# Altium schematic symbol library BARKO_SCHLIB.SchLib: 1064 symbols (part 6 of 11)
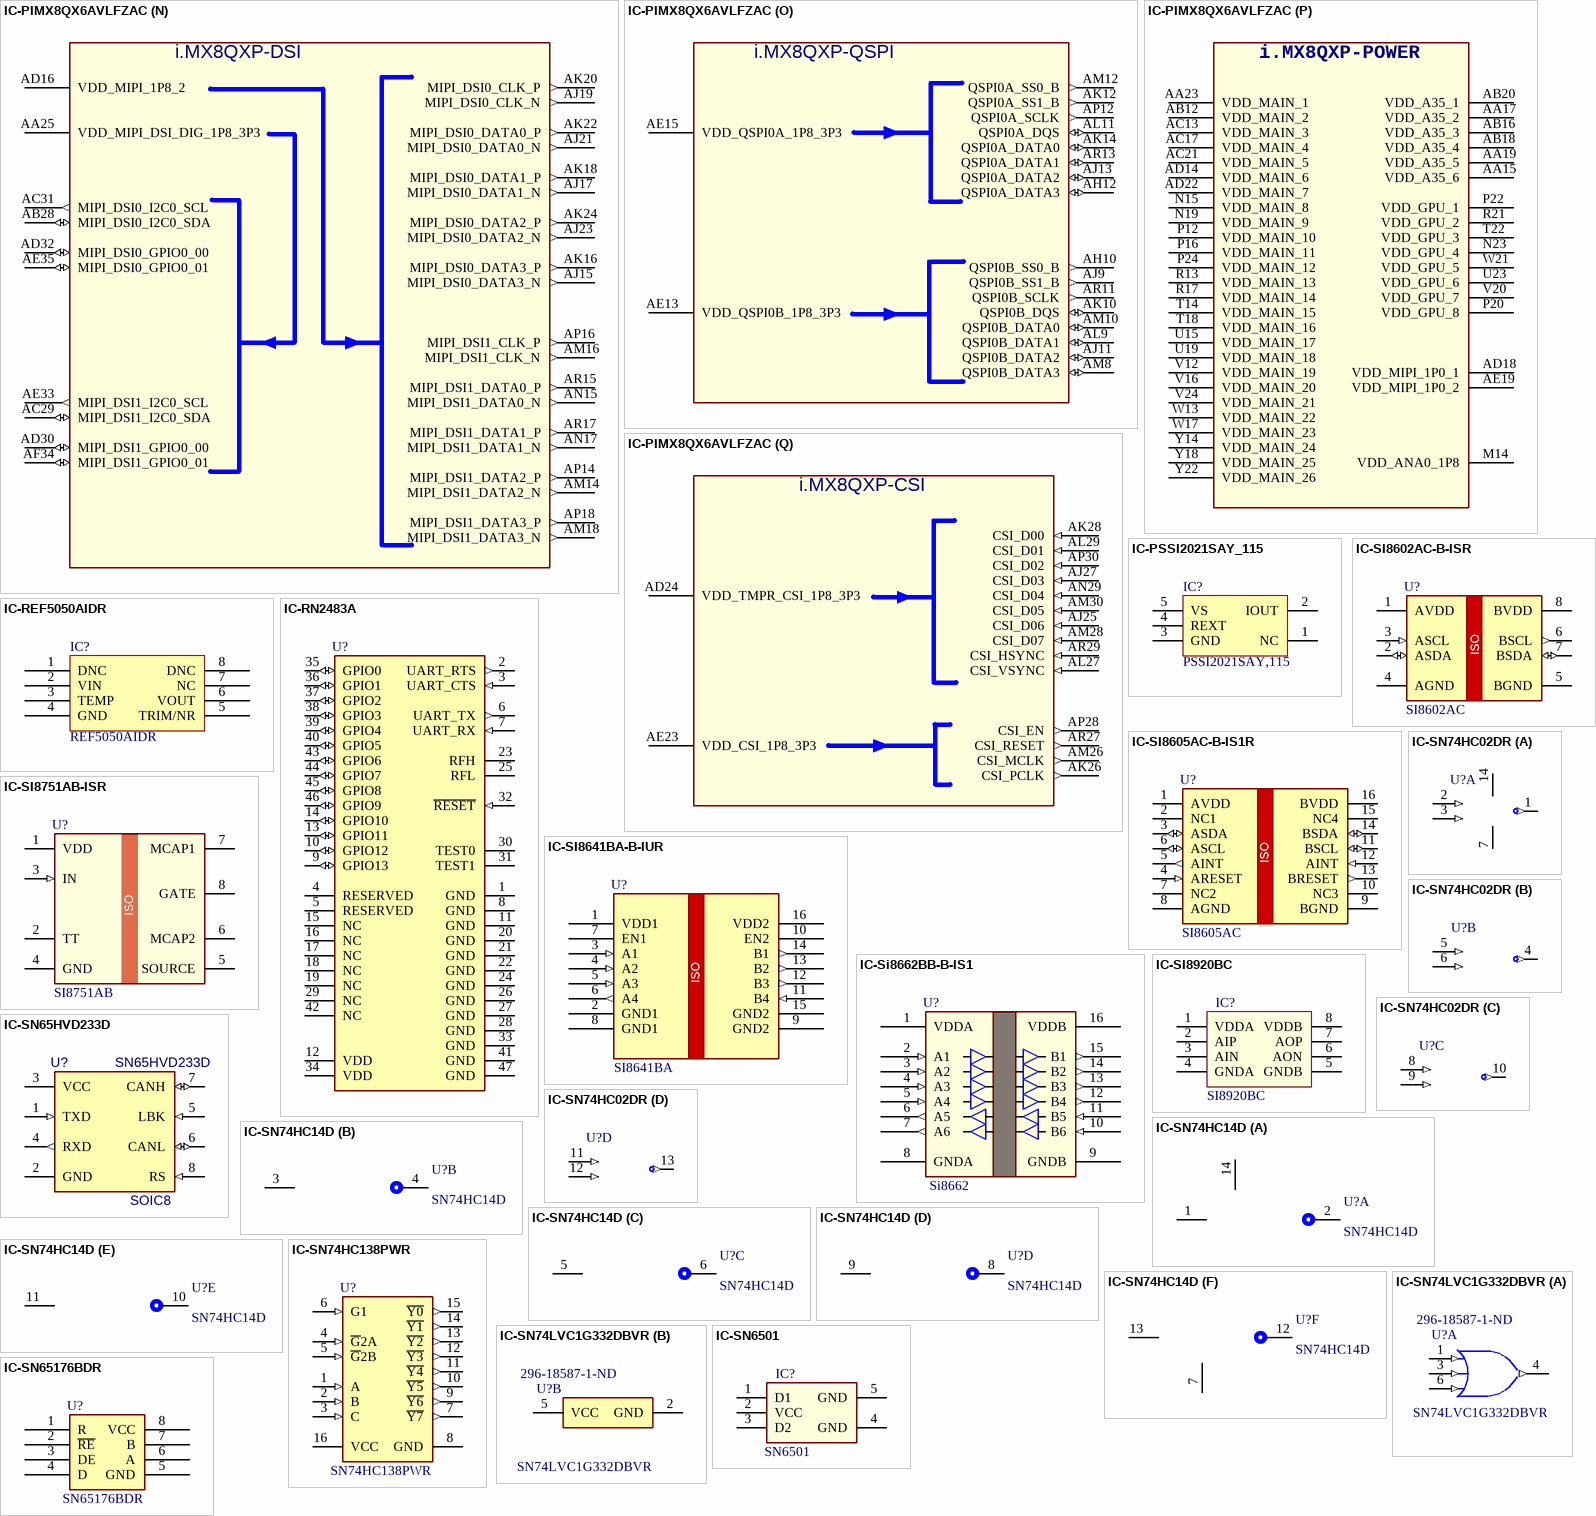
[diagram p46: symbols IC-PIMX8QX6AVLFZAC to IC-SN65176BDR]

## IC-RN2483A
designator U?, comment RN2483A-I/RM103  (value not drawn)
MODULE LORA LONG RANGE; Manufacturer: Microchip; Interface: I2C,SPI,UART; Frequency: 868MHz; Data Rate: 300Kbps; Sensitivity: -146dBm; Current - Receiving: 14mA; Current - Transmitting: 39mA; Washability: OK; .Creator: M.OZKAN; .PCBCHK: USED; Datasheet URL: http://www.microchip.com/mymicrochip/filehandler.aspx?ddocname=en574289; Package Description: 47-Pin Surface Mount Device, Body 26.67 x 17.78 mm, Pitch 1.27 mm; Package Reference: MODULE-47; RoHSCompliant: false; Mounting Technology: SurfaceMount; Datasheet Version: Rev. C, 04/2017; Manufacturer URL: http://www.microchip.com/; Supplier 1: Digi-Key; Supplier Part Number 1: RN2483A-I/RM103-ND; Manufacturer Part Number: RN2483A-I/RM103; Stock 1: 0; Pricing 1: 1=13.18000, 25=12.05120 (USD); RoHS: No; Mount: Surface Mount; Case/Package: Module; Min Operating Temperature: -40°C; Max Operating Temperature: 85°C; Packaging: Tray; ComponentLink1URL: http://www.farnell.com/datasheets/2140371.pdf?src-supplier=Farnell; ComponentLink1Description: http://www.farnell.com/datasheets/2140371.pdf?src-supplier=Farnell; ComponentLink2URL: http://www.microchip.com/mymicrochip/filehandler.aspx?ddocname=en584959&src-supplier=Digi-Key; ComponentLink2Description: http://www.microchip.com/mymicrochip/filehandler.aspx?ddocname=en584959&src-supplier=Digi-Key; .SCHCHK: USED
footprint MCHP-MODULE-47_V (SMD, 47-Leads, Body 26.67x17.78mm, Pitch 1.27mm)
pins: 1 GND (power) "Ground supply terminal", 2 UART_RTS (out) "Communication UART RTS signal, or GPIO", 3 UART_CTS (in) "Communication UART CTS signal, or GPIO", 4 RESERVED "Do not connect", 5 RESERVED "Do not connect", 6 UART_TX (out) "Communication UART Transmit (TX)", 7 UART_RX (in) "Communication UART Receive (RX)", 8 GND (power) "Ground supply terminal", 9 GPIO13 (io) "General purpose I/O pin or analog input", 10 GPIO12 (io) "General purpose I/O pin or analog input", 11 GND (power) "Ground supply terminal", 12 VDD (power) "Positive supply terminal", 13 GPIO11 (io) "General purpose I/O pin or analog input", 14 GPIO10 (io) "General purpose I/O pin or analog input", 15 NC "Not connected", 16 NC "Not connected", 17 NC "Not connected", 18 NC "Not connected", 19 NC "Not connected", 20 GND (power) "Ground supply terminal", 21 GND (power) "Ground supply terminal", 22 GND (power) "Ground supply terminal", 23 RFH "RF signal pin for high band", 24 GND (power) "Ground supply terminal", 25 RFL "RF signal pin for low band", 26 GND (power) "Ground supply terminal", 27 GND (power) "Ground supply terminal", 28 GND (power) "Ground supply terminal", 29 NC "Not connected", 30 TEST0, 31 TEST1, 32 ~{RESET} (in) "Active-low device Reset input", 33 GND (power) "Ground supply terminal", 34 VDD (power) "Positive supply terminal", 35 GPIO0 (io) "General purpose I/O pin or analog input", 36 GPIO1 (io) "General purpose I/O pin or analog input", 37 GPIO2 (io) "General purpose I/O pin or analog input", 38 GPIO3 (io) "General purpose I/O pin or analog input", 39 GPIO4 (io) "General purpose I/O pin", 40 GPIO5 (io) "General purpose I/O pin or analog input", 41 GND (power) "Ground supply terminal", 42 NC "Not connected", 43 GPIO6 (io) "General purpose I/O pin or analog input", 44 GPIO7 (io) "General purpose I/O pin or analog input", 45 GPIO8 (io) "General purpose I/O pin or analog input", 46 GPIO9 (io) "General purpose I/O pin or analog input", 47 GND (power) "Ground supply terminal"

## IC-SI8602AC-B-ISR
designator U?, comment SI8602AC
DGTL ISOL 3750VRMS 2CH I2C 8SOIC; Manufacturer: Silicon Labs; Manufacturer Part Number: SI8602AC-B-ISR; Polarity: Unidirectional,Bidirectional; Isolated Power: No; Pulse Width Distortion (PWD): 32ns; Number of Channels: 2; Data Rate: 10Mbps; Propagation Delay: 26ns; Channel Type: Bidirectional; Supplier 1: Digi-Key; Supplier Part Number 1: 336-4925-1-ND; Stock: 2635; Pricing: 1=2.99, 25=2.8792, 100=2.7685 (USD); RoHS: Yes; Case/Package: SOIC; Number of Pins: 8; Weight: 0.006596oz; Min Operating Temperature: -40°C; Max Operating Temperature: 125°C; Package Quantity: 2500; Packaging: Tape and Reel; ComponentLink1URL: https://datasheet.ciiva.com/14939/supportdocuments2ftechnicaldocs2fsi860x-14939771.pdf?src-supplier=Digi-Key; ComponentLink1Description: https://datasheet.ciiva.com/14939/supportdocuments2ftechnicaldocs2fsi860x-14939771.pdf?src-supplier=Digi-Key
footprint SOIC8-D0008A_M (SOIC, 8-Leads, Body 5x4mm, Pitch 1.27mm, IPC Low Density)
pins: 1 AVDD (power), 2 ASDA (io), 3 ASCL (in), 4 AGND (power), 5 BGND (power), 6 BSCL (out), 7 BSDA (io), 8 BVDD (power)
text: ISO

## IC-SI8605AC-B-IS1R
designator U?, comment SI8605AC
DGT ISOL 3750VRMS 4CH I2C 16SOIC; Manufacturer: Silicon Labs; Manufacturer Part Number: SI8605AC-B-IS1R; Channel Type: Bidirectional; Polarity: Unidirectional,Bidirectional; Max Power Dissipation: 275mW; Number of Channels: 4; Data Rate: 10Mbps; Propagation Delay: 26ns; Isolated Power: No; Pulse Width Distortion (PWD): 32ns; Supplier 1: Digi-Key; Supplier Part Number 1: 336-4927-1-ND; Stock: 6049; Pricing: 1=3.8, 25=3.6548, 100=3.5143, 1000=3.1866 (USD); RoHS: Yes; Case/Package: SOIC; Weight: 0.005069oz; Min Operating Temperature: -40°C; Max Operating Temperature: 125°C; Package Quantity: 2500; Packaging: Tape and Reel; ComponentLink1URL: https://datasheet.ciiva.com/14939/supportdocuments2ftechnicaldocs2fsi860x-14939670.pdf?src-supplier=Digi-Key; ComponentLink1Description: https://datasheet.ciiva.com/14939/supportdocuments2ftechnicaldocs2fsi860x-14939670.pdf?src-supplier=Digi-Key
footprint SOIC16
pins: 1 AVDD (power), 2 NC1, 3 ASDA (io), 4 ARESET (in), 5 AINT (out), 6 ASCL (io), 7 NC2, 8 AGND, 9 BGND, 10 NC3, 11 BSCL (io), 12 AINT (in), 13 BRESET (out), 14 BSDA (io), 15 NC4, 16 BVDD
text: ISO

## IC-SI8641BA-B-IUR
designator U?, comment SI8641BA
DGTL ISO 1KV 4CH GEN PURP 16QSOP; Manufacturer: Silicon Labs; Manufacturer Part Number: SI8641BA-B-IUR; Number of Channels: 4; Data Rate: 150Mbps; Propagation Delay: 13ns; Channel Type: Unidirectional; Isolated Power: No; Pulse Width Distortion (PWD): 4.5ns; Washability: OK; .Creator: M.OZKAN; .PCBCHK: USED; Supplier 1: Digi-Key; Stock 1: 2478; Pricing 1: 1=2.51000, 25=2.42080, 100=2.32780 (USD); RoHS: Yes; Case/Package: QSOP; Number of Pins: 16; Weight: 0.002931oz; Min Operating Temperature: -40°C; Max Operating Temperature: 125°C; Package Quantity: 2500; Packaging: Tape and Reel; Type: General Purpose; ComponentLink1URL: https://datasheet.ciiva.com/15273/si864x-15273040.pdf?src-supplier=Arrow+Europe; ComponentLink1Description: https://datasheet.ciiva.com/15273/si864x-15273040.pdf?src-supplier=Arrow+Europe; ComponentLink2URL: https://datasheet.ciiva.com/14939/supportdocuments2ftechnicaldocs2fsi864x-14939870.pdf?src-supplier=Digi-Key; ComponentLink2Description: https://datasheet.ciiva.com/14939/supportdocuments2ftechnicaldocs2fsi864x-14939870.pdf?src-supplier=Digi-Key; Supplier Part Number 1: 336-4333-1-ND; .SCHCHK: USED
footprint 16-SSOP
pins: 1 VDD1, 2 GND1, 3 A1 (in), 4 A2 (in), 5 A3 (in), 6 A4 (out), 7 EN1, 8 GND1, 9 GND2, 10 EN2, 11 B4 (in), 12 B3 (out), 13 B2 (out), 14 B1 (out), 15 GND2, 16 VDD2
text: ISO

## IC-Si8662BB-B-IS1
designator U?, comment Si8662
DGTL ISO 2.5KV GEN PURP 16SOIC; Manufacturer: Silicon Labs; Manufacturer Part Number: Si8662BB-B-IS1; Number of Channels: 6; Data Rate: 150Mbps; Propagation Delay: 13ns; Min Supply Voltage: 2.5V; Max Supply Voltage: 5.5V; Max Power Dissipation: 415mW; Channel Type: Unidirectional; Turn-On Delay Time: 10ns; Operating Supply Current: 19.4mA; Isolated Power: No; Pulse Width Distortion (PWD): 4.5ns; Max Input Current: 10.5mA; Rise Time: 4ns; Washability: OK; .Creator: M.OZKAN; .PCBCHK: USED; Supplier 1: Digi-Key; Stock 1: 2241; Pricing 1: 1=3,16000, 25=3,04360, 100=2,92670, 1000=2,72330 (USD); RoHS: Yes; Mount: Surface Mount; Case/Package: SOIC; Number of Pins: 16; Contact Plating: Tin,Matte; Min Operating Temperature: -40°C; Max Operating Temperature: 125°C; Packaging: Rail/Tube; Package Quantity: 48; Polarity: Unidirectional; Isolation Voltage: 2.5kV; Type: General Purpose; Length: 9.9mm; Depth: 1.25mm; Width: 3.9mm; REACH SVHC: Unknown; ComponentLink1URL: http://www.farnell.com/datasheets/2244979.pdf?src-supplier=Farnell; ComponentLink1Description: http://www.farnell.com/datasheets/2244979.pdf?src-supplier=Farnell; ComponentLink2URL: http://www.mouser.com/ds/2/368/Si866x-41125.pdf?src-supplier=Mouser; ComponentLink2Description: http://www.mouser.com/ds/2/368/Si866x-41125.pdf?src-supplier=Mouser; ComponentLink3URL: https://www.silabs.com/Support%20Documents/TechnicalDocs/Si866x.pdf?src-supplier=Digi-Key; ComponentLink3Description: https://www.silabs.com/Support%20Documents/TechnicalDocs/Si866x.pdf?src-supplier=Digi-Key; ComponentLink4URL: http://www.silabs.com/Support%20Documents/TechnicalDocs/Si866x.pdf?src-supplier=Avnet; ComponentLink4Description: http://www.silabs.com/Support%20Documents/TechnicalDocs/Si866x.pdf?src-supplier=Avnet; ComponentLink5URL: http://www.farnell.com/datasheets/1816593.pdf?src-supplier=Element14; ComponentLink5Description: http://www.farnell.com/datasheets/1816593.pdf?src-supplier=Element14; ComponentLink6URL: http://www.silabs.com/Support%20Documents/TechnicalDocs/Si866x.pdf?src-supplier=Avnet+Asia; ComponentLink6Description: http://www.silabs.com/Support%20Documents/TechnicalDocs/Si866x.pdf?src-supplier=Avnet+Asia; Supplier Part Number 1: SI8662BB-B-IS1-ND; .SCHCHK: USED
footprint SOIC16
pins: 1 VDDA (power), 2 A1 (in), 3 A2 (in), 4 A3 (in), 5 A4 (in), 6 A5 (out), 7 A6 (out), 8 GNDA (power), 9 GNDB (power), 10 B6 (in), 11 B5 (in), 12 B4 (out), 13 B3 (out), 14 B2 (out), 15 B1 (out), 16 VDDB (power)

## IC-SI8751AB-ISR
designator U?, comment SI8751AB
DGTL ISO 2.5KV GATE DRIVER 8SOIC; Manufacturer: Silicon Labs; Manufacturer Part Number: SI8751AB-ISR; Number of Channels: 1; Approvals: CSA,VDE,UR,CQC; Supplier 1: Digi-Key; Supplier Part Number 1: 336-3797-1-ND; Stock: 2422; Pricing: 1=1.38, 25=1.328, 100=1.2769 (USD); RoHS: Yes; Mount: Surface Mount; Case/Package: SOIC; Number of Pins: 8; Min Operating Temperature: -40°C; Max Operating Temperature: 105°C; Packaging: Tape and Reel; REACH SVHC: No SVHC; ComponentLink1URL: https://www.silabs.com/documents/public/data-sheets/Si8751-2.pdf?src-supplier=Digi-Key; ComponentLink1Description: https://www.silabs.com/documents/public/data-sheets/Si8751-2.pdf?src-supplier=Digi-Key; ComponentLink2URL: http://www.farnell.com/datasheets/2131143.pdf?src-supplier=Element14; ComponentLink2Description: http://www.farnell.com/datasheets/2131143.pdf?src-supplier=Element14; ComponentLink3URL: http://www.farnell.com/datasheets/2247952.pdf?src-supplier=Newark; ComponentLink3Description: http://www.farnell.com/datasheets/2247952.pdf?src-supplier=Newark; ComponentLink4URL: http://www.silabs.com/documents/public/data-sheets/Si8751-2.pdf?src-supplier=Digi-Key; ComponentLink4Description: http://www.silabs.com/documents/public/data-sheets/Si8751-2.pdf?src-supplier=Digi-Key
footprint SOIC8-D0008A_M (SOIC, 8-Leads, Body 5x4mm, Pitch 1.27mm, IPC Low Density)
pins: 1 VDD (power), 2 TT, 3 IN (in), 4 GND (power), 5 SOURCE, 6 MCAP2, 7 MCAP1, 8 GATE
text: ISO

## IC-SI8920BC
designator IC?, comment SI8920BC
IC ISOLATION 8DIP GULL WING; Manufacturer: Silicon Labs; Manufacturer Part Number: SI8920BC-IPR; Gain Bandwidth Product: 750kHz; Min Supply Voltage: 3V; Max Supply Voltage: 5.5V; Supplier 1: Mouser; Stock 1: 2163; Pricing 1: 1=2.93000, 10=2.88000, 25=2.82000, 50=2.77000, 100=2.71000, 250=2.70000 (USD); RoHS: Yes; Mount: Surface Mount; Case/Package: SMD/SMT; Number of Pins: 8; Min Operating Temperature: -40°C; Max Operating Temperature: 125°C; ComponentLink1URL: http://www.silabs.com/Support%20Documents/TechnicalDocs/Si8920.pdf?src-supplier=Avnet; ComponentLink1Description: http://www.silabs.com/Support%20Documents/TechnicalDocs/Si8920.pdf?src-supplier=Avnet; ComponentLink2URL: https://www.silabs.com/documents/public/data-sheets/si8920-datasheet.pdf?src-supplier=Digi-Key; ComponentLink2Description: https://www.silabs.com/documents/public/data-sheets/si8920-datasheet.pdf?src-supplier=Digi-Key; ComponentLink3URL: http://www.silabs.com/documents/public/data-sheets/si8920-datasheet.pdf?src-supplier=Digi-Key; ComponentLink3Description: http://www.silabs.com/documents/public/data-sheets/si8920-datasheet.pdf?src-supplier=Digi-Key; Supplier Part Number 1: 634-SI8920BC-IPR
footprint 8-SMD-Gull Wing
pins: 1 VDDA, 2 AIP, 3 AIN, 4 GNDA, 5 GNDB, 6 AON, 7 AOP, 8 VDDB

## IC-SN65HVD233D
designator U?, comment SN65HVD233D  Case/Package: SOIC8
IC 3.3V CAN TXRX 8-SOIC; Manufacturer: Texas Instruments; Data Rate: 1Mbps; Max Supply Voltage: 3.6V; Min Supply Voltage: 3V; Nominal Supply Current: 6mA; Number of Transceivers: 1; .PCBCHK: USED; .Creator: F:TALI; Washability: OK; Supplier 1: Digi-Key; Manufacturer Part Number: SN65HVD233D; Stock 1: 13664; Pricing 1: 1=3.13, 10=2.816, 75=2.66173, 150=2.30687, 525=1.96377, 1050=1.6562, 2550=1.57339, 5025=1.51424 (USD); Number of Pins: 8; Weight: 0.002561oz; Contact Plating: Gold; Min Operating Temperature: -40°C; Max Operating Temperature: 125°C; Package Quantity: 75; Packaging: Rail/Tube; Number of Drivers: 1; Number of Receivers: 1; Operating Supply Voltage: 3.3V; Max Supply Current: 6mA; Length: 4.9mm; Height: 1.58mm; Width: 3.91mm; Radiation Hardening: No; Lead Free: Lead Free; REACH SVHC: No SVHC; ComponentLink1URL: http://www.ti.com/lit/ds/symlink/sn65hvd233.pdf; ComponentLink1Description: http://www.ti.com/lit/ds/symlink/sn65hvd233.pdf; ComponentLink2URL: http://www.ti.com/general/docs/lit/getliterature.tsp?genericPartNumber=SN65HVD233&amp;&amp;fileType=pdf; ComponentLink2Description: http://www.ti.com/general/docs/lit/getliterature.tsp?genericPartNumber=SN65HVD233&amp;&amp;fileType=pdf; ComponentLink3URL: http://www.jameco.com/Jameco/Products/ProdDS/909986.pdf; ComponentLink3Description: http://www.jameco.com/Jameco/Products/ProdDS/909986.pdf; ComponentLink4URL: http://www.produktinfo.conrad.com/datenblaetter/1100000-1199999/001186923-da-01-en-IC_3_3V_CAN_TXRX_SN65HVD233D_SOIC_8_TID.pdf; ComponentLink4Description: http://www.produktinfo.conrad.com/datenblaetter/1100000-1199999/001186923-da-01-en-IC_3_3V_CAN_TXRX_SN65HVD233D_SOIC_8_TID.pdf; Supplier Part Number 1: 296-14639-5-ND; .SCHCHK: USED
footprint SOIC8
pins: 1 TXD (in), 2 GND (power), 3 VCC (power), 4 RXD (out), 5 LBK (in), 6 CANL (io), 7 CANH (io), 8 RS (in)

## IC-SN74HC02DR
designator U?, comment NOR Gate IC 4 Channel 14-SOIC  (value not drawn)
IC GATE NOR 4CH 2-INP 14-SOIC; Manufacturer: Texas Instruments; Manufacturer Part Number: SN74HC02DR; Propagation Delay: 15ns; Number of Inputs: 2; Low Level Output Current: 5.2mA; Number of Circuits: 4; Quiescent Current: 2uA; Washability: OK; .Creator: M.OZKAN; .PCBCHK: USED; ComponentLink1URL: https://datasheet.ciiva.com/27050/914566-27050911.pdf?src-supplier=Jameco; ComponentLink1Description: https://datasheet.ciiva.com/27050/914566-27050911.pdf?src-supplier=Jameco; ComponentLink2URL: https://datasheet.ciiva.com/15090/getdatasheetpartid-71593-15090525.pdf?src-supplier=Verical; ComponentLink2Description: https://datasheet.ciiva.com/15090/getdatasheetpartid-71593-15090525.pdf?src-supplier=Verical; ComponentLink3URL: https://datasheet.ciiva.com/1864/sn74hc02-1864695.pdf?src-supplier=Digi-Key; ComponentLink3Description: https://datasheet.ciiva.com/1864/sn74hc02-1864695.pdf?src-supplier=Digi-Key; ComponentLink4URL: https://datasheet.ciiva.com/1864/sn74hc02-1864697.pdf?src-supplier=Digi-Key; ComponentLink4Description: https://datasheet.ciiva.com/1864/sn74hc02-1864697.pdf?src-supplier=Digi-Key; ComponentLink5URL: https://datasheet.ciiva.com/26242/sn74hc02-26242831.pdf?src-supplier=Avnet+Europe; ComponentLink5Description: https://datasheet.ciiva.com/26242/sn74hc02-26242831.pdf?src-supplier=Avnet+Europe; ComponentLink6URL: https://datasheet.ciiva.com/46393/1882828-46393797.pdf?src-supplier=Element14; ComponentLink6Description: https://datasheet.ciiva.com/46393/1882828-46393797.pdf?src-supplier=Element14; ComponentLink7URL: https://datasheet.ciiva.com/14290/sn74hc02-14290503.pdf?src-supplier=Avnet; ComponentLink7Description: https://datasheet.ciiva.com/14290/sn74hc02-14290503.pdf?src-supplier=Avnet; ComponentLink8URL: https://datasheet.ciiva.com/1864/sn74hc02-1864696.pdf?src-supplier=Digi-Key; ComponentLink8Description: https://datasheet.ciiva.com/1864/sn74hc02-1864696.pdf?src-supplier=Digi-Key; Supplier 1: Digi-Key; Supplier Part Number 1: 296-1188-6-ND; Stock 1: 4392; Pricing 1: 1=0.41000, 10=0.30800, 100=0.19180, 500=0.13122, 1000=0.10094 (USD); RoHS: Yes; Mount: Surface Mount; Case/Package: SOIC; Number of Pins: 14; Min Operating Temperature: -40°C; Max Operating Temperature: 85°C; Packaging: Tape and Reel; Logic Function: NOR; High Level Output Current: 5.2mA; Number of Bits: 4; Lead Free: Lead Free; .SCHCHK: USED
footprint IC-D14-NOR
part A pins: 1 (out), 2 (in), 3 (in), 7, 14
part B pins: 4 (out), 5 (in), 6 (in)
part C pins: 8 (in), 9 (in), 10 (out)
part D pins: 11 (in), 12 (in), 13 (out)

## IC-SN74HC14D
designator U?, comment SN74HC14D
IC INVERTER SCHMITT 6CH 14SOIC; Manufacturer: Texas Instruments; Number of Inputs: 1; Min Supply Voltage: 2V; Max Supply Voltage: 6V; Propagation Delay: 21ns; Operating Supply Voltage: 5V; Number of Elements: 6; Logic Function: Buffer,Inverter,Schmitt Trigger; Low Level Output Current: 5.2mA; Quiescent Current: 2uA; High Level Output Current: -5.2mA; Turn-On Delay Time: 155ns; Schmitt Trigger Input: Yes; .Creator: F:TALI; .PCBCHK: USED; Washability: OK; Supplier 1: Digi-Key; Manufacturer Part Number: SN74HC14D; Stock 1: 11897; Pricing 1: 1=0.41, 10=0.329, 50=0.301, 100=0.224, 500=0.168, 1000=0.126, 2500=0.1155, 5000=0.1085 (USD); Mount: Surface Mount; Case/Package: SOIC; Number of Pins: 14; Weight: 0.004318oz; Contact Plating: Gold; Min Operating Temperature: -40°C; Max Operating Temperature: 85°C; Packaging: Rail/Tube; Package Quantity: 50; Number of Circuits: 6; Number of Gates: 6; Number of Bits: 6; Output Current: 5.2mA; Max Output Current: 5.2mA; Length: 8.65mm; Height: 1.58mm; Width: 3.91mm; Radiation Hardening: No; Lead Free: Lead Free; REACH SVHC: No SVHC; ComponentLink1URL: http://www.farnell.com/datasheets/1882348.pdf?src-supplier=Element14; ComponentLink1Description: http://www.farnell.com/datasheets/1882348.pdf?src-supplier=Element14; ComponentLink2URL: http://focus.ti.com/lit/ds/symlink/sn54hc14.pdf?src-supplier=Avnet+Europe; ComponentLink2Description: http://focus.ti.com/lit/ds/symlink/sn54hc14.pdf?src-supplier=Avnet+Europe; ComponentLink3URL: http://www.ti.com/general/docs/lit/getliterature.tsp?genericPartNumber=SN54HC14-SP&&fileType=pdf&src-supplier=Avnet; ComponentLink3Description: http://www.ti.com/general/docs/lit/getliterature.tsp?genericPartNumber=SN54HC14-SP&&fileType=pdf&src-supplier=Avnet; ComponentLink4URL: https://www.verical.com/server-webapp/html/getDatasheet?partID=134868&src-supplier=Verical; ComponentLink4Description: https://www.verical.com/server-webapp/html/getDatasheet?partID=134868&src-supplier=Verical; ComponentLink5URL: http://www.ti.com/lit/ds/symlink/sn74hc14.pdf?src-supplier=Digi-Key; ComponentLink5Description: http://www.ti.com/lit/ds/symlink/sn74hc14.pdf?src-supplier=Digi-Key; ComponentLink6URL: http://www.produktinfo.conrad.com/datenblaetter/1000000-1099999/001016661-da-01-en-IC_HEX_SCHM_TRI_SN_SN74HC14D_SOIC_14_TID.pdf?src-supplier=Conrad; ComponentLink6Description: http://www.produktinfo.conrad.com/datenblaetter/1000000-1099999/001016661-da-01-en-IC_HEX_SCHM_TRI_SN_SN74HC14D_SOIC_14_TID.pdf?src-supplier=Conrad; Supplier Part Number 1: 296-1194-5-ND; .SCHCHK: USED
footprint SOIC14
part A pins: 1, 2, 14
part B pins: 3, 4
part C pins: 5, 6
part D pins: 8, 9
part E pins: 10, 11
part F pins: 7, 12, 13

## IC-SN74HC138PWR
designator U?, comment SN74HC138PWR
IC 3-TO-8 DECODER/DEMUX 16-TSSOP; Manufacturer: Texas Instruments; Propagation Delay: 225ns; Max Supply Voltage: 6V; Min Supply Voltage: 2V; Operating Supply Voltage: 5V; Logic Function: Demultiplexer,Decoder; Number of Elements: 1; Number of Outputs: 8; Number of Inputs: 3; Power Dissipation: 320mW; High Level Output Current: -5.2mA; Low Level Output Current: 5.2mA; Polarity: Inverting; Quiescent Current: 8uA; Supply Type: Single; Bandwidth: 28MHz; Washability: OK; .Creator: M.OZKAN; .PCBCHK: USED; Supplier 1: Digi-Key; Supplier Part Number 1: 296-8228-1-ND; Manufacturer Part Number: SN74HC138PWR; Stock 1: 16385; Pricing 1: 1=0.38000, 10=0.30500, 25=0.27920, 100=0.20760, 250=0.18820, 500=0.15574, 1000=0.11680 (USD); RoHS: Yes; Mount: Surface Mount; Case/Package: TSSOP; Number of Pins: 16; Weight: 0.002183oz; Contact Plating: Gold; Min Operating Temperature: -40°C; Max Operating Temperature: 85°C; Packaging: Tape and Reel; Package Quantity: 2000; Number of Input Lines: 3; Number of Output Lines: 8; Turn-On Delay Time: 225ns; Number of Circuits: 1; Number of Bits: 8; Independent Circuits: 1; Number of Channels: 1; Radiation Hardening: No; REACH SVHC: No SVHC; Lead Free: Lead Free; ComponentLink1URL: https://datasheet.ciiva.com/14292/sn74hc138-14292869.pdf?src-supplier=Avnet; ComponentLink1Description: https://datasheet.ciiva.com/14292/sn74hc138-14292869.pdf?src-supplier=Avnet; ComponentLink2URL: https://datasheet.ciiva.com/1888/sn74hc138-1888631.pdf?src-supplier=Digi-Key; ComponentLink2Description: https://datasheet.ciiva.com/1888/sn74hc138-1888631.pdf?src-supplier=Digi-Key; ComponentLink3URL: https://datasheet.ciiva.com/26259/sn54hc138-sp-26259623.pdf?src-supplier=Avnet+Europe; ComponentLink3Description: https://datasheet.ciiva.com/26259/sn54hc138-sp-26259623.pdf?src-supplier=Avnet+Europe; ComponentLink4URL: https://datasheet.ciiva.com/1888/sn74hc138-1888632.pdf?src-supplier=Digi-Key; ComponentLink4Description: https://datasheet.ciiva.com/1888/sn74hc138-1888632.pdf?src-supplier=Digi-Key; ComponentLink5URL: https://datasheet.ciiva.com/1888/sn74hc138-1888633.pdf?src-supplier=Digi-Key; ComponentLink5Description: https://datasheet.ciiva.com/1888/sn74hc138-1888633.pdf?src-supplier=Digi-Key; ComponentLink6URL: https://datasheet.ciiva.com/46393/1885857-46393964.pdf?src-supplier=Element14; ComponentLink6Description: https://datasheet.ciiva.com/46393/1885857-46393964.pdf?src-supplier=Element14; ComponentLink7URL: https://datasheet.ciiva.com/46394/1885857-46394029.pdf?src-supplier=Element14; ComponentLink7Description: https://datasheet.ciiva.com/46394/1885857-46394029.pdf?src-supplier=Element14; .SCHCHK: USED
footprint TSSOP16
pins: 1 A (in), 2 B (in), 3 C (in), 4 ~{G}2A (in), 5 ~{G}2B (in), 6 G1 (in), 7 ~{Y7} (out), 8 GND (power), 9 ~{Y6} (out), 10 ~{Y5} (out), 11 ~{Y4} (out), 12 ~{Y3} (out), 13 ~{Y2} (out), 14 ~{Y1} (out), 15 ~{Y0} (out), 16 VCC (power)

## IC-SN74LVC1G332DBVR
designator U?, comment SN74LVC1G332DBVR  Supplier Part Number 1: 296-18587-1-ND
IC GATE OR 1CH 3-INP SOT23-6; Manufacturer: Texas Instruments; Min Supply Voltage: 1.65V; Max Supply Voltage: 5.5V; Quiescent Current: 10uA; Propagation Delay: 3.5ns; Low Level Output Current: 32mA; Number of Inputs: 3; Number of Circuits: 1; High Level Output Current: -32mA; Turn-On Delay Time: 4.8ns; Output Current: 50mA; Schmitt Trigger Input: No; Washability: OK; .Creator: M.OZKAN; .PCBCHK: USED; Supplier 1: Digi-Key; Manufacturer Part Number: SN74LVC1G332DBVR; Stock 1: 5896; Pricing 1: 1=0.46000, 10=0.34600, 100=0.21530, 500=0.14730, 1000=0.11330 (USD); RoHS: Yes; Mount: Surface Mount; Case/Package: SOT-23; Number of Pins: 6; Weight: 0.000557oz; Contact Plating: Tin,Matte; Min Operating Temperature: -40°C; Max Operating Temperature: 125°C; Logic Function: OR; Package Quantity: 1; Packaging: Tape and Reel; Number of Gates: 1; Number of Bits: 1; Number of Elements: 1; Number of Outputs: 1; Number of Input Lines: 3; Number of Output Lines: 1; Max Output Current: 32mA; Termination: SMD/SMT; Length: 3.05mm; Height: 1.3mm; Width: 1.75mm; Radiation Hardening: No; Lead Free: Lead Free; REACH SVHC: No SVHC; ComponentLink1URL: https://datasheet.ciiva.com/1864/sn74lvc1g332-1864512.pdf?src-supplier=Digi-Key; ComponentLink1Description: https://datasheet.ciiva.com/1864/sn74lvc1g332-1864512.pdf?src-supplier=Digi-Key; ComponentLink2URL: https://datasheet.ciiva.com/22716/1737075-22716920.pdf?src-supplier=Element14; ComponentLink2Description: https://datasheet.ciiva.com/22716/1737075-22716920.pdf?src-supplier=Element14; ComponentLink3URL: https://datasheet.ciiva.com/4217/sces489e-4217577.pdf?src-supplier=Arrow; ComponentLink3Description: https://datasheet.ciiva.com/4217/sces489e-4217577.pdf?src-supplier=Arrow; ComponentLink4URL: https://datasheet.ciiva.com/6124/1795976-6124826.pdf?src-supplier=Farnell; ComponentLink4Description: https://datasheet.ciiva.com/6124/1795976-6124826.pdf?src-supplier=Farnell; ComponentLink5URL: https://datasheet.ciiva.com/15090/getdatasheetpartid-173079-15090970.pdf?src-supplier=Verical; ComponentLink5Description: https://datasheet.ciiva.com/15090/getdatasheetpartid-173079-15090970.pdf?src-supplier=Verical; ComponentLink6URL: https://datasheet.ciiva.com/1864/sn74lvc1g332-rev2006-1864513.pdf?src-supplier=Digi-Key; ComponentLink6Description: https://datasheet.ciiva.com/1864/sn74lvc1g332-rev2006-1864513.pdf?src-supplier=Digi-Key; ComponentLink7URL: https://datasheet.ciiva.com/1864/sn74lvc1g332-rev2006-1864514.pdf?src-supplier=Digi-Key; ComponentLink7Description: https://datasheet.ciiva.com/1864/sn74lvc1g332-rev2006-1864514.pdf?src-supplier=Digi-Key; ComponentLink8URL: https://datasheet.ciiva.com/14290/sn74lvc1g332-14290789.pdf?src-supplier=Avnet; ComponentLink8Description: https://datasheet.ciiva.com/14290/sn74lvc1g332-14290789.pdf?src-supplier=Avnet; ComponentLink9URL: https://datasheet.ciiva.com/26218/sn74lvc1g332-26218406.pdf?src-supplier=Avnet+Europe; ComponentLink9Description: https://datasheet.ciiva.com/26218/sn74lvc1g332-26218406.pdf?src-supplier=Avnet+Europe; ComponentLink10URL: https://datasheet.ciiva.com/14290/sn74lvc1g332-14290791.pdf?src-supplier=Avnet; ComponentLink10Description: https://datasheet.ciiva.com/14290/sn74lvc1g332-14290791.pdf?src-supplier=Avnet; .SCHCHK: USED
footprint DBV0006A_N (SOT23, 6-Leads, Body 3.05x1.75mm, Pitch 0.95mm, IPC Medium Density)
footprint DBV0006A_M (SOT23, 6-Leads, Body 3.05x1.75mm, Pitch 0.95mm, IPC Low Density)
footprint DBV0006A_L (SOT23, 6-Leads, Body 3.05x1.75mm, Pitch 0.95mm, IPC High Density)
part A pins: 1 A (in), 3 B (in), 4 Y (out), 6 C (in)
part B pins: 2 GND (power), 5 VCC (power)

## IC-SN6501
designator IC?, comment SN6501
Transformer Driver PMIC SOT-23-5; Manufacturer: Texas Instruments; Manufacturer Part Number: SN6501DBVR; Output Voltage: 11V; Output Current: 250mA; Max Supply Voltage: 5.5V; Min Supply Voltage: 3V; Number of Outputs: 1; Switching Frequency: 620kHz; Max Output Current: 350mA; Output Type: Adjustable; Operating Supply Current: 300uA; Supplier 1: Arrow Electronics; Stock 1: 3598; Pricing 1: 1=1.81430, 10=1.56530, 25=1.51350, 100=1.24470, 250=1.09290, 500=1.05480, 1000=0.95060, 3000=0.84640, 3000=0.85460, 6000=0.81150, 15000=0.81130, 30000=0.79270, 3000=0.88000, 30000=0.86880, 300000=0.80270, 1500000=0.76730, 3000000=0.76700 (USD); RoHS: Yes; Mount: Surface Mount; Case/Package: SOT-23-5; Number of Pins: 5; Contact Plating: Tin,Matte; Min Operating Temperature: -40°C; Max Operating Temperature: 125°C; Package Quantity: 3000; Packaging: Tape and Reel; Min Input Voltage: 3V; Max Input Voltage: 5.5V; REACH SVHC: No SVHC; Lead Free: Lead Free; ComponentLink1URL: https://datasheet.ciiva.com/15268/901sn6501-15268022.pdf?src-supplier=Arrow+Europe; ComponentLink1Description: https://datasheet.ciiva.com/15268/901sn6501-15268022.pdf?src-supplier=Arrow+Europe; ComponentLink2URL: https://datasheet.ciiva.com/41798/sn6501-41798985.pdf?src-supplier=Digi-Key; ComponentLink2Description: https://datasheet.ciiva.com/41798/sn6501-41798985.pdf?src-supplier=Digi-Key; Supplier Part Number 1: SN6501DBVR
footprint SOT23-5
pins: 1 D1, 2 VCC, 3 D2, 4 GND, 5 GND

## IC-SN65176BDR
designator U?, comment SN65176BDR